# Altium footprint library Connector_PinHeader_1.27mm.PcbLib: 278 footprints (part 2 of 18)
Each footprint in its own frame and in the unit in brackets; x right, y up, seen from the top. Pads: shape width x height; smd on the part's side, far side on the other; paste and mask are expansions set on the pad; w line width, h text height; cw(c..) or ccw(c..) is an arc to the next point about the centre after c.
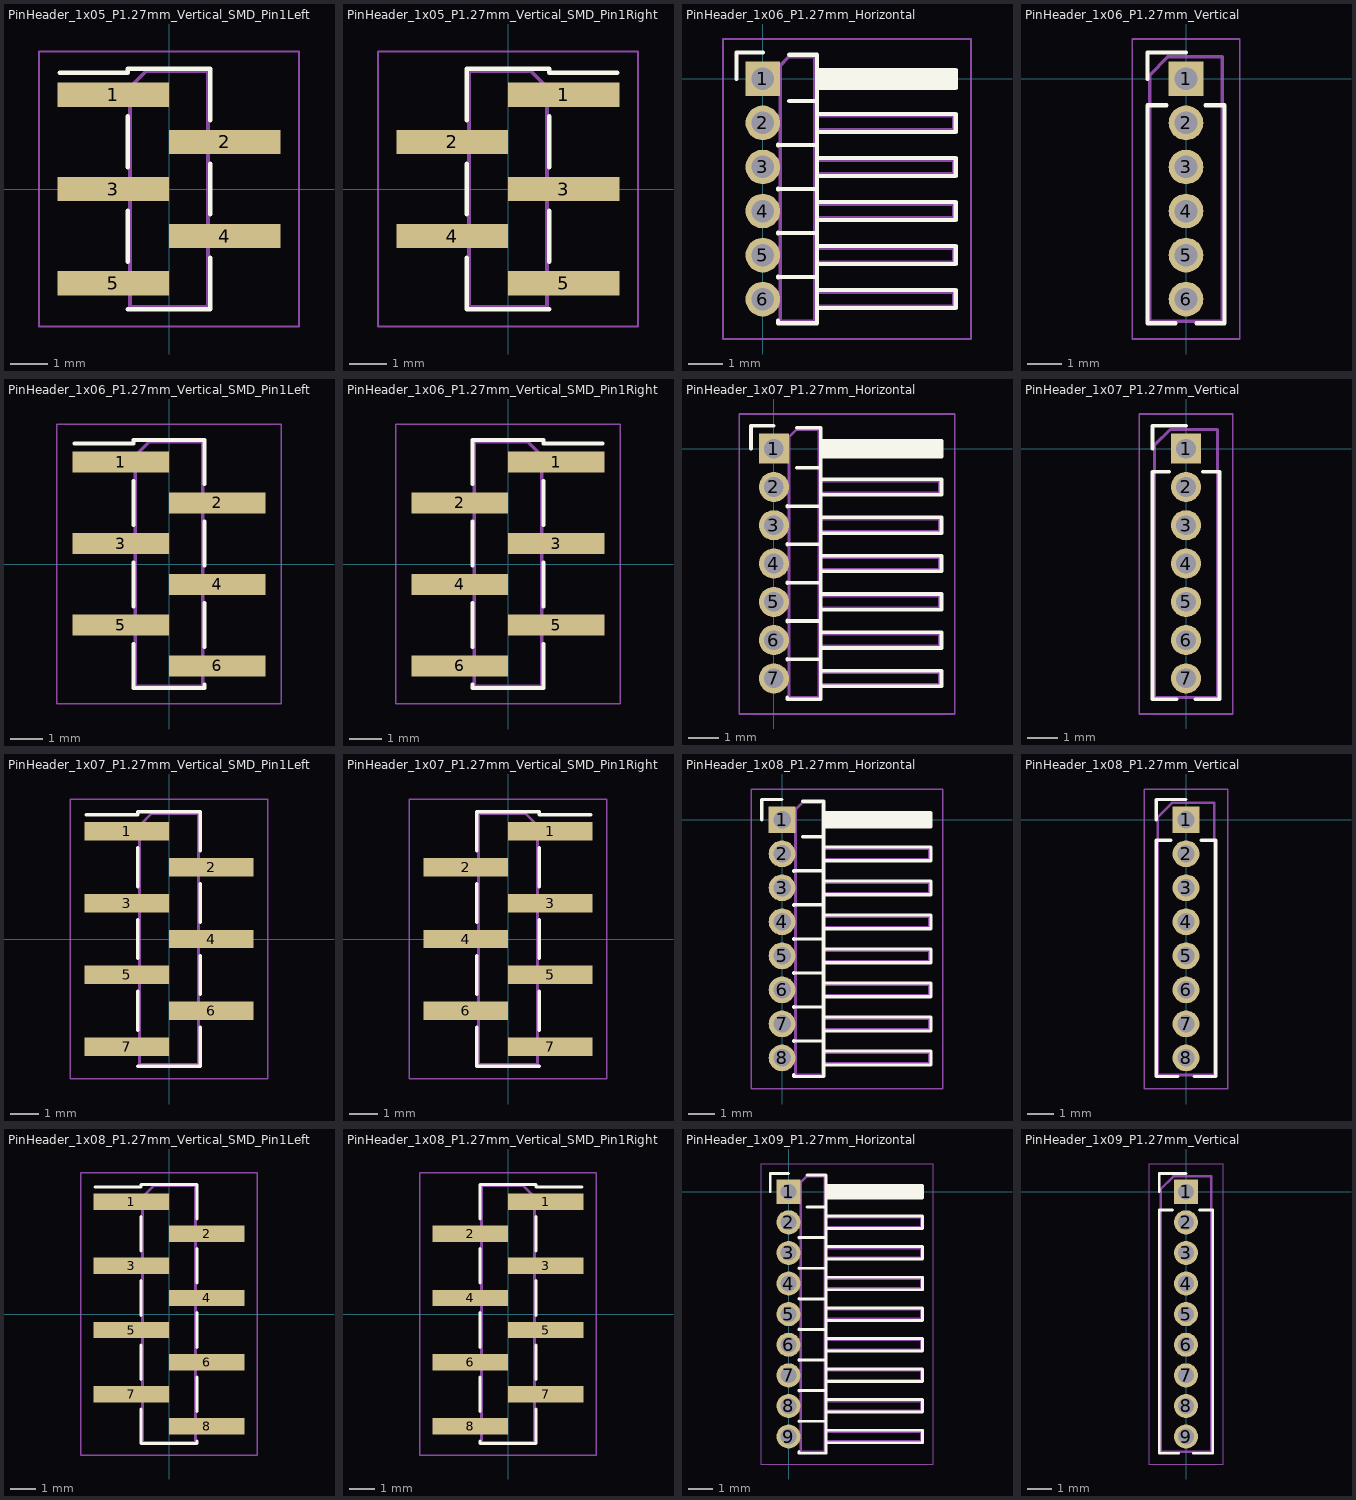
[diagram p1: the footprints below, top view; thin cyan lines are the x and y axes]

## PinHeader_1x05_P1.27mm_Vertical_SMD_Pin1Left [mm]
pads (5):
  rect 3x0.65 smd: 1(-1.5,2.54) 2(1.5,1.27) 3(-1.5,0) 4(1.5,-1.27) 5(-1.5,-2.54)
F.SilkS:
  lines w0.12: -2.94,3.125 -1.11,3.125 -1.11,3.235 1.11,3.235 ; -1.11,-3.235 1.11,-3.235 1.11,-3.125 ; -1.11,-1.955 -1.11,-0.585 ; -1.11,0.585 -1.11,1.955 ; 1.11,-3.225 1.11,-1.855 ; 1.11,-0.685 1.11,0.685 ; 1.11,1.855 1.11,3.225
F.CrtYd:
  lines w0.05: -3.5,-3.7 3.5,-3.7 3.5,3.7 -3.5,3.7 -3.5,-3.7
F.Fab:
  lines w0.1: -1.05,-2.74 -2.5,-2.74 -2.5,-2.34 -1.05,-2.34 ; -1.05,-0.2 -2.5,-0.2 -2.5,0.2 -1.05,0.2 ; -1.05,2.34 -2.5,2.34 -2.5,2.74 -1.05,2.74 ; 1.05,-1.47 2.5,-1.47 2.5,-1.07 1.05,-1.07 ; 1.05,1.07 2.5,1.07 2.5,1.47 1.05,1.47 ; -1.05,2.74 -0.615,3.175 1.05,3.175 1.05,-3.175 -1.05,-3.175 -1.05,2.74
  text "'.Designator'" at 0.84,-4.047 h1

## PinHeader_1x05_P1.27mm_Vertical_SMD_Pin1Right [mm]
pads (5):
  rect 3x0.65 smd: 1(1.5,2.54) 2(-1.5,1.27) 3(1.5,0) 4(-1.5,-1.27) 5(1.5,-2.54)
F.SilkS:
  lines w0.12: -1.11,-3.225 -1.11,-1.855 ; -1.11,-3.125 -1.11,-3.235 1.11,-3.235 ; -1.11,-0.685 -1.11,0.685 ; -1.11,1.855 -1.11,3.225 ; -1.11,3.235 1.11,3.235 1.11,3.125 2.94,3.125 ; 1.11,-1.955 1.11,-0.585 ; 1.11,0.585 1.11,1.955
F.CrtYd:
  lines w0.05: -3.5,-3.7 -3.5,3.7 3.5,3.7 3.5,-3.7 -3.5,-3.7
F.Fab:
  lines w0.1: -1.05,-1.47 -2.5,-1.47 -2.5,-1.07 -1.05,-1.07 ; -1.05,1.07 -2.5,1.07 -2.5,1.47 -1.05,1.47 ; 1.05,-2.74 2.5,-2.74 2.5,-2.34 1.05,-2.34 ; 1.05,-0.2 2.5,-0.2 2.5,0.2 1.05,0.2 ; 1.05,2.34 2.5,2.34 2.5,2.74 1.05,2.74 ; 1.05,2.74 1.05,-3.175 -1.05,-3.175 -1.05,3.175 0.615,3.175 1.05,2.74
  text "'.Designator'" at 0.84,-4.047 h1

## PinHeader_1x06_P1.27mm_Horizontal [mm]
pads (6):
  rect 1x1 hole 0.65: 1(0,0)
  rrect100% 1x1 hole 0.65: 2(0,-1.27) 3(0,-2.54) 4(0,-3.81) 5(0,-5.08) 6(0,-6.35)
F.SilkS:
  lines w0.12: -0.76,0 -0.76,0.76 0,0.76 ; 0.44,-6.97 0.44,-7.045 1.56,-7.045 1.56,0.695 0.76,0.695 ; 0.44,-5.73 0.44,-5.7 ; 0.44,-5.715 1.56,-5.715 ; 0.44,-4.46 0.44,-4.43 ; 0.44,-4.445 1.56,-4.445 ; 0.44,-3.19 0.44,-3.16 ; 0.44,-3.175 1.56,-3.175 ; 0.44,-1.92 0.44,-1.89 ; 0.44,-1.905 1.56,-1.905 ; 0.76,-0.635 1.56,-0.635 ; 1.56,-6.61 5.56,-6.61 5.56,-6.09 1.56,-6.09 ; 1.56,-5.34 5.56,-5.34 5.56,-4.82 1.56,-4.82 ; 1.56,-4.07 5.56,-4.07 5.56,-3.55 1.56,-3.55 ; 1.56,-2.8 5.56,-2.8 5.56,-2.28 1.56,-2.28 ; 1.56,-1.53 5.56,-1.53 5.56,-1.01 1.56,-1.01 ; 1.56,-0.26 5.56,-0.26 5.56,0.26 1.56,0.26 ; 1.56,-0.16 5.56,-0.16 ; 1.56,-0.04 5.56,-0.04 ; 1.56,0.08 5.56,0.08 ; 1.56,0.2 5.56,0.2
F.CrtYd:
  lines w0.05: -1.15,-7.5 6,-7.5 6,1.15 -1.15,1.15 -1.15,-7.5
F.Fab:
  lines w0.1: 0.5,-6.55 -0.2,-6.55 -0.2,-6.15 0.5,-6.15 ; 0.5,-5.28 -0.2,-5.28 -0.2,-4.88 0.5,-4.88 ; 0.5,-4.01 -0.2,-4.01 -0.2,-3.61 0.5,-3.61 ; 0.5,-2.74 -0.2,-2.74 -0.2,-2.34 0.5,-2.34 ; 0.5,-1.47 -0.2,-1.47 -0.2,-1.07 0.5,-1.07 ; 0.5,-0.2 -0.2,-0.2 -0.2,0.2 0.5,0.2 ; 1.5,-6.55 5.5,-6.55 5.5,-6.15 1.5,-6.15 ; 1.5,-5.28 5.5,-5.28 5.5,-4.88 1.5,-4.88 ; 1.5,-4.01 5.5,-4.01 5.5,-3.61 1.5,-3.61 ; 1.5,-2.74 5.5,-2.74 5.5,-2.34 1.5,-2.34 ; 1.5,-1.47 5.5,-1.47 5.5,-1.07 1.5,-1.07 ; 1.5,-0.2 5.5,-0.2 5.5,0.2 1.5,0.2 ; 0.5,-6.985 0.5,0.385 0.75,0.635 1.5,0.635 1.5,-6.985 0.5,-6.985
  text "'.Designator'" at 1.504,-5.603 h0.6

## PinHeader_1x06_P1.27mm_Vertical [mm]
pads (6):
  rect 1x1 hole 0.65: 1(0,0)
  rrect100% 1x1 hole 0.65: 2(0,-1.27) 3(0,-2.54) 4(0,-3.81) 5(0,-5.08) 6(0,-6.35)
F.SilkS:
  lines w0.12: -1.11,0 -1.11,0.76 0,0.76 ; -0.563,-0.76 -1.11,-0.76 -1.11,-7.045 -0.308,-7.045 ; 0.308,-7.045 1.11,-7.045 1.11,-0.76 0.563,-0.76
F.CrtYd:
  lines w0.05: -1.55,-7.5 1.55,-7.5 1.55,1.15 -1.55,1.15 -1.55,-7.5
F.Fab:
  lines w0.1: -1.05,-6.985 1.05,-6.985 1.05,0.635 -0.525,0.635 -1.05,0.11 -1.05,-6.985
  text "'.Designator'" at 0.84,-7.222 h1

## PinHeader_1x06_P1.27mm_Vertical_SMD_Pin1Left [mm]
pads (6):
  rect 3x0.65 smd: 1(-1.5,3.175) 2(1.5,1.905) 3(-1.5,0.635) 4(1.5,-0.635) 5(-1.5,-1.905) 6(1.5,-3.175)
F.SilkS:
  lines w0.12: -2.94,3.76 -1.11,3.76 -1.11,3.87 1.11,3.87 ; -1.11,-3.87 1.11,-3.87 1.11,-3.76 ; -1.11,-3.86 -1.11,-2.49 ; -1.11,-1.32 -1.11,0.05 ; -1.11,1.22 -1.11,2.59 ; 1.11,-2.59 1.11,-1.22 ; 1.11,-0.05 1.11,1.32 ; 1.11,2.49 1.11,3.86
F.CrtYd:
  lines w0.05: -3.5,-4.35 3.5,-4.35 3.5,4.35 -3.5,4.35 -3.5,-4.35
F.Fab:
  lines w0.1: -1.05,-2.105 -2.5,-2.105 -2.5,-1.705 -1.05,-1.705 ; -1.05,0.435 -2.5,0.435 -2.5,0.835 -1.05,0.835 ; -1.05,2.975 -2.5,2.975 -2.5,3.375 -1.05,3.375 ; 1.05,-3.375 2.5,-3.375 2.5,-2.975 1.05,-2.975 ; 1.05,-0.835 2.5,-0.835 2.5,-0.435 1.05,-0.435 ; 1.05,1.705 2.5,1.705 2.5,2.105 1.05,2.105 ; -1.05,3.375 -0.615,3.81 1.05,3.81 1.05,-3.81 -1.05,-3.81 -1.05,3.375
  text "'.Designator'" at 0.84,-4.047 h1

## PinHeader_1x06_P1.27mm_Vertical_SMD_Pin1Right [mm]
pads (6):
  rect 3x0.65 smd: 1(1.5,3.175) 2(-1.5,1.905) 3(1.5,0.635) 4(-1.5,-0.635) 5(1.5,-1.905) 6(-1.5,-3.175)
F.SilkS:
  lines w0.12: -1.11,-3.76 -1.11,-3.87 1.11,-3.87 ; -1.11,-2.59 -1.11,-1.22 ; -1.11,-0.05 -1.11,1.32 ; -1.11,2.49 -1.11,3.86 ; -1.11,3.87 1.11,3.87 1.11,3.76 2.94,3.76 ; 1.11,-3.86 1.11,-2.49 ; 1.11,-1.32 1.11,0.05 ; 1.11,1.22 1.11,2.59
F.CrtYd:
  lines w0.05: -3.5,-4.35 3.5,-4.35 3.5,4.35 -3.5,4.35 -3.5,-4.35
F.Fab:
  lines w0.1: -1.05,-3.375 -2.5,-3.375 -2.5,-2.975 -1.05,-2.975 ; -1.05,-0.835 -2.5,-0.835 -2.5,-0.435 -1.05,-0.435 ; -1.05,1.705 -2.5,1.705 -2.5,2.105 -1.05,2.105 ; 1.05,-2.105 2.5,-2.105 2.5,-1.705 1.05,-1.705 ; 1.05,0.435 2.5,0.435 2.5,0.835 1.05,0.835 ; 1.05,2.975 2.5,2.975 2.5,3.375 1.05,3.375 ; 1.05,3.375 0.615,3.81 -1.05,3.81 -1.05,-3.81 1.05,-3.81 1.05,3.375
  text "'.Designator'" at 0.84,-4.047 h1

## PinHeader_1x07_P1.27mm_Horizontal [mm]
pads (7):
  rect 1x1 hole 0.65: 1(0,0)
  rrect100% 1x1 hole 0.65: 2(0,-1.27) 3(0,-2.54) 4(0,-3.81) 5(0,-5.08) 6(0,-6.35) 7(0,-7.62)
F.SilkS:
  lines w0.12: -0.76,0 -0.76,0.76 0,0.76 ; 0.44,-8.24 0.44,-8.315 1.56,-8.315 1.56,0.695 0.76,0.695 ; 0.44,-7 0.44,-6.97 ; 0.44,-6.985 1.56,-6.985 ; 0.44,-5.73 0.44,-5.7 ; 0.44,-5.715 1.56,-5.715 ; 0.44,-4.46 0.44,-4.43 ; 0.44,-4.445 1.56,-4.445 ; 0.44,-3.19 0.44,-3.16 ; 0.44,-3.175 1.56,-3.175 ; 0.44,-1.92 0.44,-1.89 ; 0.44,-1.905 1.56,-1.905 ; 0.76,-0.635 1.56,-0.635 ; 1.56,-7.88 5.56,-7.88 5.56,-7.36 1.56,-7.36 ; 1.56,-6.61 5.56,-6.61 5.56,-6.09 1.56,-6.09 ; 1.56,-5.34 5.56,-5.34 5.56,-4.82 1.56,-4.82 ; 1.56,-4.07 5.56,-4.07 5.56,-3.55 1.56,-3.55 ; 1.56,-2.8 5.56,-2.8 5.56,-2.28 1.56,-2.28 ; 1.56,-1.53 5.56,-1.53 5.56,-1.01 1.56,-1.01 ; 1.56,-0.26 5.56,-0.26 5.56,0.26 1.56,0.26 ; 1.56,-0.16 5.56,-0.16 ; 1.56,-0.04 5.56,-0.04 ; 1.56,0.08 5.56,0.08 ; 1.56,0.2 5.56,0.2
F.CrtYd:
  lines w0.05: -1.15,-8.8 -1.15,1.15 6,1.15 6,-8.8 -1.15,-8.8
F.Fab:
  lines w0.1: 0.5,-7.82 -0.2,-7.82 -0.2,-7.42 0.5,-7.42 ; 0.5,-6.55 -0.2,-6.55 -0.2,-6.15 0.5,-6.15 ; 0.5,-5.28 -0.2,-5.28 -0.2,-4.88 0.5,-4.88 ; 0.5,-4.01 -0.2,-4.01 -0.2,-3.61 0.5,-3.61 ; 0.5,-2.74 -0.2,-2.74 -0.2,-2.34 0.5,-2.34 ; 0.5,-1.47 -0.2,-1.47 -0.2,-1.07 0.5,-1.07 ; 0.5,-0.2 -0.2,-0.2 -0.2,0.2 0.5,0.2 ; 1.5,-7.82 5.5,-7.82 5.5,-7.42 1.5,-7.42 ; 1.5,-6.55 5.5,-6.55 5.5,-6.15 1.5,-6.15 ; 1.5,-5.28 5.5,-5.28 5.5,-4.88 1.5,-4.88 ; 1.5,-4.01 5.5,-4.01 5.5,-3.61 1.5,-3.61 ; 1.5,-2.74 5.5,-2.74 5.5,-2.34 1.5,-2.34 ; 1.5,-1.47 5.5,-1.47 5.5,-1.07 1.5,-1.07 ; 1.5,-0.2 5.5,-0.2 5.5,0.2 1.5,0.2 ; 0.5,-8.255 1.5,-8.255 1.5,0.635 0.75,0.635 0.5,0.385 0.5,-8.255
  text "'.Designator'" at 1.504,-6.238 h0.6

## PinHeader_1x07_P1.27mm_Vertical [mm]
pads (7):
  rect 1x1 hole 0.65: 1(0,0)
  rrect100% 1x1 hole 0.65: 2(0,-1.27) 3(0,-2.54) 4(0,-3.81) 5(0,-5.08) 6(0,-6.35) 7(0,-7.62)
F.SilkS:
  lines w0.12: -1.11,0 -1.11,0.76 0,0.76 ; -0.563,-0.76 -1.11,-0.76 -1.11,-8.315 -0.308,-8.315 ; 0.308,-8.315 1.11,-8.315 1.11,-0.76 0.563,-0.76
F.CrtYd:
  lines w0.05: -1.55,-8.8 1.55,-8.8 1.55,1.15 -1.55,1.15 -1.55,-8.8
F.Fab:
  lines w0.1: -1.05,-8.255 -1.05,0.11 -0.525,0.635 1.05,0.635 1.05,-8.255 -1.05,-8.255
  text "'.Designator'" at 0.84,-7.857 h1

## PinHeader_1x07_P1.27mm_Vertical_SMD_Pin1Left [mm]
pads (7):
  rect 3x0.65 smd: 1(-1.5,3.81) 2(1.5,2.54) 3(-1.5,1.27) 4(1.5,0) 5(-1.5,-1.27) 6(1.5,-2.54) 7(-1.5,-3.81)
F.SilkS:
  lines w0.12: -2.94,4.395 -1.11,4.395 -1.11,4.505 1.11,4.505 ; -1.11,-4.505 1.11,-4.505 1.11,-4.395 ; -1.11,-3.225 -1.11,-1.855 ; -1.11,-0.685 -1.11,0.685 ; -1.11,1.855 -1.11,3.225 ; 1.11,-4.495 1.11,-3.125 ; 1.11,-1.955 1.11,-0.585 ; 1.11,0.585 1.11,1.955 ; 1.11,3.125 1.11,4.495
F.CrtYd:
  lines w0.05: -3.5,-4.95 -3.5,4.95 3.5,4.95 3.5,-4.95 -3.5,-4.95
F.Fab:
  lines w0.1: -1.05,-4.01 -2.5,-4.01 -2.5,-3.61 -1.05,-3.61 ; -1.05,-1.47 -2.5,-1.47 -2.5,-1.07 -1.05,-1.07 ; -1.05,1.07 -2.5,1.07 -2.5,1.47 -1.05,1.47 ; -1.05,3.61 -2.5,3.61 -2.5,4.01 -1.05,4.01 ; 1.05,-2.74 2.5,-2.74 2.5,-2.34 1.05,-2.34 ; 1.05,-0.2 2.5,-0.2 2.5,0.2 1.05,0.2 ; 1.05,2.34 2.5,2.34 2.5,2.74 1.05,2.74 ; -1.05,4.01 -0.615,4.445 1.05,4.445 1.05,-4.445 -1.05,-4.445 -1.05,4.01
  text "'.Designator'" at 0.84,-4.047 h1

## PinHeader_1x07_P1.27mm_Vertical_SMD_Pin1Right [mm]
pads (7):
  rect 3x0.65 smd: 1(1.5,3.81) 2(-1.5,2.54) 3(1.5,1.27) 4(-1.5,0) 5(1.5,-1.27) 6(-1.5,-2.54) 7(1.5,-3.81)
F.SilkS:
  lines w0.12: -1.11,-4.495 -1.11,-3.125 ; -1.11,-4.395 -1.11,-4.505 1.11,-4.505 ; -1.11,-1.955 -1.11,-0.585 ; -1.11,0.585 -1.11,1.955 ; -1.11,3.125 -1.11,4.495 ; -1.11,4.505 1.11,4.505 1.11,4.395 2.94,4.395 ; 1.11,-3.225 1.11,-1.855 ; 1.11,-0.685 1.11,0.685 ; 1.11,1.855 1.11,3.225
F.CrtYd:
  lines w0.05: -3.5,-4.95 3.5,-4.95 3.5,4.95 -3.5,4.95 -3.5,-4.95
F.Fab:
  lines w0.1: -1.05,-2.74 -2.5,-2.74 -2.5,-2.34 -1.05,-2.34 ; -1.05,-0.2 -2.5,-0.2 -2.5,0.2 -1.05,0.2 ; -1.05,2.34 -2.5,2.34 -2.5,2.74 -1.05,2.74 ; 1.05,-4.01 2.5,-4.01 2.5,-3.61 1.05,-3.61 ; 1.05,-1.47 2.5,-1.47 2.5,-1.07 1.05,-1.07 ; 1.05,1.07 2.5,1.07 2.5,1.47 1.05,1.47 ; 1.05,3.61 2.5,3.61 2.5,4.01 1.05,4.01 ; 1.05,4.01 0.615,4.445 -1.05,4.445 -1.05,-4.445 1.05,-4.445 1.05,4.01
  text "'.Designator'" at 0.84,-4.047 h1

## PinHeader_1x08_P1.27mm_Horizontal [mm]
pads (8):
  rect 1x1 hole 0.65: 1(0,0)
  rrect100% 1x1 hole 0.65: 2(0,-1.27) 3(0,-2.54) 4(0,-3.81) 5(0,-5.08) 6(0,-6.35) 7(0,-7.62) 8(0,-8.89)
F.SilkS:
  lines w0.12: -0.76,0 -0.76,0.76 0,0.76 ; 0.44,-9.51 0.44,-9.585 1.56,-9.585 1.56,0.695 0.76,0.695 ; 0.44,-8.27 0.44,-8.24 ; 0.44,-8.255 1.56,-8.255 ; 0.44,-7 0.44,-6.97 ; 0.44,-6.985 1.56,-6.985 ; 0.44,-5.73 0.44,-5.7 ; 0.44,-5.715 1.56,-5.715 ; 0.44,-4.46 0.44,-4.43 ; 0.44,-4.445 1.56,-4.445 ; 0.44,-3.19 0.44,-3.16 ; 0.44,-3.175 1.56,-3.175 ; 0.44,-1.92 0.44,-1.89 ; 0.44,-1.905 1.56,-1.905 ; 0.76,-0.635 1.56,-0.635 ; 1.56,-9.15 5.56,-9.15 5.56,-8.63 1.56,-8.63 ; 1.56,-7.88 5.56,-7.88 5.56,-7.36 1.56,-7.36 ; 1.56,-6.61 5.56,-6.61 5.56,-6.09 1.56,-6.09 ; 1.56,-5.34 5.56,-5.34 5.56,-4.82 1.56,-4.82 ; 1.56,-4.07 5.56,-4.07 5.56,-3.55 1.56,-3.55 ; 1.56,-2.8 5.56,-2.8 5.56,-2.28 1.56,-2.28 ; 1.56,-1.53 5.56,-1.53 5.56,-1.01 1.56,-1.01 ; 1.56,-0.26 5.56,-0.26 5.56,0.26 1.56,0.26 ; 1.56,-0.16 5.56,-0.16 ; 1.56,-0.04 5.56,-0.04 ; 1.56,0.08 5.56,0.08 ; 1.56,0.2 5.56,0.2
F.CrtYd:
  lines w0.05: -1.15,-10.05 -1.15,1.15 6,1.15 6,-10.05 -1.15,-10.05
F.Fab:
  lines w0.1: 0.5,-9.09 -0.2,-9.09 -0.2,-8.69 0.5,-8.69 ; 0.5,-7.82 -0.2,-7.82 -0.2,-7.42 0.5,-7.42 ; 0.5,-6.55 -0.2,-6.55 -0.2,-6.15 0.5,-6.15 ; 0.5,-5.28 -0.2,-5.28 -0.2,-4.88 0.5,-4.88 ; 0.5,-4.01 -0.2,-4.01 -0.2,-3.61 0.5,-3.61 ; 0.5,-2.74 -0.2,-2.74 -0.2,-2.34 0.5,-2.34 ; 0.5,-1.47 -0.2,-1.47 -0.2,-1.07 0.5,-1.07 ; 0.5,-0.2 -0.2,-0.2 -0.2,0.2 0.5,0.2 ; 1.5,-9.09 5.5,-9.09 5.5,-8.69 1.5,-8.69 ; 1.5,-7.82 5.5,-7.82 5.5,-7.42 1.5,-7.42 ; 1.5,-6.55 5.5,-6.55 5.5,-6.15 1.5,-6.15 ; 1.5,-5.28 5.5,-5.28 5.5,-4.88 1.5,-4.88 ; 1.5,-4.01 5.5,-4.01 5.5,-3.61 1.5,-3.61 ; 1.5,-2.74 5.5,-2.74 5.5,-2.34 1.5,-2.34 ; 1.5,-1.47 5.5,-1.47 5.5,-1.07 1.5,-1.07 ; 1.5,-0.2 5.5,-0.2 5.5,0.2 1.5,0.2 ; 0.5,-9.525 1.5,-9.525 1.5,0.635 0.75,0.635 0.5,0.385 0.5,-9.525
  text "'.Designator'" at 1.504,-6.873 h0.6

## PinHeader_1x08_P1.27mm_Vertical [mm]
pads (8):
  rect 1x1 hole 0.65: 1(0,0)
  rrect100% 1x1 hole 0.65: 2(0,-1.27) 3(0,-2.54) 4(0,-3.81) 5(0,-5.08) 6(0,-6.35) 7(0,-7.62) 8(0,-8.89)
F.SilkS:
  lines w0.12: -1.11,0 -1.11,0.76 0,0.76 ; -0.563,-0.76 -1.11,-0.76 -1.11,-9.585 -0.308,-9.585 ; 0.308,-9.585 1.11,-9.585 1.11,-0.76 0.563,-0.76
F.CrtYd:
  lines w0.05: -1.55,-10.05 1.55,-10.05 1.55,1.15 -1.55,1.15 -1.55,-10.05
F.Fab:
  lines w0.1: -1.05,-9.525 -1.05,0.11 -0.525,0.635 1.05,0.635 1.05,-9.525 -1.05,-9.525
  text "'.Designator'" at 0.84,-8.492 h1

## PinHeader_1x08_P1.27mm_Vertical_SMD_Pin1Left [mm]
pads (8):
  rect 3x0.65 smd: 1(-1.5,4.445) 2(1.5,3.175) 3(-1.5,1.905) 4(1.5,0.635) 5(-1.5,-0.635) 6(1.5,-1.905) 7(-1.5,-3.175) 8(1.5,-4.445)
F.SilkS:
  lines w0.12: -2.94,5.03 -1.11,5.03 -1.11,5.14 1.11,5.14 ; -1.11,-5.14 1.11,-5.14 1.11,-5.03 ; -1.11,-5.13 -1.11,-3.76 ; -1.11,-2.59 -1.11,-1.22 ; -1.11,-0.05 -1.11,1.32 ; -1.11,2.49 -1.11,3.86 ; 1.11,-3.86 1.11,-2.49 ; 1.11,-1.32 1.11,0.05 ; 1.11,1.22 1.11,2.59 ; 1.11,3.76 1.11,5.13
F.CrtYd:
  lines w0.05: -3.5,-5.6 3.5,-5.6 3.5,5.6 -3.5,5.6 -3.5,-5.6
F.Fab:
  lines w0.1: -1.05,-3.375 -2.5,-3.375 -2.5,-2.975 -1.05,-2.975 ; -1.05,-0.835 -2.5,-0.835 -2.5,-0.435 -1.05,-0.435 ; -1.05,1.705 -2.5,1.705 -2.5,2.105 -1.05,2.105 ; -1.05,4.245 -2.5,4.245 -2.5,4.645 -1.05,4.645 ; 1.05,-4.645 2.5,-4.645 2.5,-4.245 1.05,-4.245 ; 1.05,-2.105 2.5,-2.105 2.5,-1.705 1.05,-1.705 ; 1.05,0.435 2.5,0.435 2.5,0.835 1.05,0.835 ; 1.05,2.975 2.5,2.975 2.5,3.375 1.05,3.375 ; -1.05,4.645 -0.615,5.08 1.05,5.08 1.05,-5.08 -1.05,-5.08 -1.05,4.645
  text "'.Designator'" at 0.84,-4.047 h1

## PinHeader_1x08_P1.27mm_Vertical_SMD_Pin1Right [mm]
pads (8):
  rect 3x0.65 smd: 1(1.5,4.445) 2(-1.5,3.175) 3(1.5,1.905) 4(-1.5,0.635) 5(1.5,-0.635) 6(-1.5,-1.905) 7(1.5,-3.175) 8(-1.5,-4.445)
F.SilkS:
  lines w0.12: -1.11,-5.03 -1.11,-5.14 1.11,-5.14 ; -1.11,-3.86 -1.11,-2.49 ; -1.11,-1.32 -1.11,0.05 ; -1.11,1.22 -1.11,2.59 ; -1.11,3.76 -1.11,5.13 ; -1.11,5.14 1.11,5.14 1.11,5.03 2.94,5.03 ; 1.11,-5.13 1.11,-3.76 ; 1.11,-2.59 1.11,-1.22 ; 1.11,-0.05 1.11,1.32 ; 1.11,2.49 1.11,3.86
F.CrtYd:
  lines w0.05: -3.5,-5.6 3.5,-5.6 3.5,5.6 -3.5,5.6 -3.5,-5.6
F.Fab:
  lines w0.1: -1.05,-4.645 -2.5,-4.645 -2.5,-4.245 -1.05,-4.245 ; -1.05,-2.105 -2.5,-2.105 -2.5,-1.705 -1.05,-1.705 ; -1.05,0.435 -2.5,0.435 -2.5,0.835 -1.05,0.835 ; -1.05,2.975 -2.5,2.975 -2.5,3.375 -1.05,3.375 ; 1.05,-3.375 2.5,-3.375 2.5,-2.975 1.05,-2.975 ; 1.05,-0.835 2.5,-0.835 2.5,-0.435 1.05,-0.435 ; 1.05,1.705 2.5,1.705 2.5,2.105 1.05,2.105 ; 1.05,4.245 2.5,4.245 2.5,4.645 1.05,4.645 ; 1.05,4.645 0.615,5.08 -1.05,5.08 -1.05,-5.08 1.05,-5.08 1.05,4.645
  text "'.Designator'" at 0.84,-4.047 h1

## PinHeader_1x09_P1.27mm_Horizontal [mm]
pads (9):
  rect 1x1 hole 0.65: 1(0,0)
  rrect100% 1x1 hole 0.65: 2(0,-1.27) 3(0,-2.54) 4(0,-3.81) 5(0,-5.08) 6(0,-6.35) 7(0,-7.62) 8(0,-8.89) 9(0,-10.16)
F.SilkS:
  lines w0.12: -0.76,0 -0.76,0.76 0,0.76 ; 0.44,-10.78 0.44,-10.855 1.56,-10.855 1.56,0.695 0.76,0.695 ; 0.44,-9.54 0.44,-9.51 ; 0.44,-9.525 1.56,-9.525 ; 0.44,-8.27 0.44,-8.24 ; 0.44,-8.255 1.56,-8.255 ; 0.44,-7 0.44,-6.97 ; 0.44,-6.985 1.56,-6.985 ; 0.44,-5.73 0.44,-5.7 ; 0.44,-5.715 1.56,-5.715 ; 0.44,-4.46 0.44,-4.43 ; 0.44,-4.445 1.56,-4.445 ; 0.44,-3.19 0.44,-3.16 ; 0.44,-3.175 1.56,-3.175 ; 0.44,-1.92 0.44,-1.89 ; 0.44,-1.905 1.56,-1.905 ; 0.76,-0.635 1.56,-0.635 ; 1.56,-10.42 5.56,-10.42 5.56,-9.9 1.56,-9.9 ; 1.56,-9.15 5.56,-9.15 5.56,-8.63 1.56,-8.63 ; 1.56,-7.88 5.56,-7.88 5.56,-7.36 1.56,-7.36 ; 1.56,-6.61 5.56,-6.61 5.56,-6.09 1.56,-6.09 ; 1.56,-5.34 5.56,-5.34 5.56,-4.82 1.56,-4.82 ; 1.56,-4.07 5.56,-4.07 5.56,-3.55 1.56,-3.55 ; 1.56,-2.8 5.56,-2.8 5.56,-2.28 1.56,-2.28 ; 1.56,-1.53 5.56,-1.53 5.56,-1.01 1.56,-1.01 ; 1.56,-0.26 5.56,-0.26 5.56,0.26 1.56,0.26 ; 1.56,-0.16 5.56,-0.16 ; 1.56,-0.04 5.56,-0.04 ; 1.56,0.08 5.56,0.08 ; 1.56,0.2 5.56,0.2
F.CrtYd:
  lines w0.05: -1.15,-11.3 6,-11.3 6,1.15 -1.15,1.15 -1.15,-11.3
F.Fab:
  lines w0.1: 0.5,-10.36 -0.2,-10.36 -0.2,-9.96 0.5,-9.96 ; 0.5,-9.09 -0.2,-9.09 -0.2,-8.69 0.5,-8.69 ; 0.5,-7.82 -0.2,-7.82 -0.2,-7.42 0.5,-7.42 ; 0.5,-6.55 -0.2,-6.55 -0.2,-6.15 0.5,-6.15 ; 0.5,-5.28 -0.2,-5.28 -0.2,-4.88 0.5,-4.88 ; 0.5,-4.01 -0.2,-4.01 -0.2,-3.61 0.5,-3.61 ; 0.5,-2.74 -0.2,-2.74 -0.2,-2.34 0.5,-2.34 ; 0.5,-1.47 -0.2,-1.47 -0.2,-1.07 0.5,-1.07 ; 0.5,-0.2 -0.2,-0.2 -0.2,0.2 0.5,0.2 ; 1.5,-10.36 5.5,-10.36 5.5,-9.96 1.5,-9.96 ; 1.5,-9.09 5.5,-9.09 5.5,-8.69 1.5,-8.69 ; 1.5,-7.82 5.5,-7.82 5.5,-7.42 1.5,-7.42 ; 1.5,-6.55 5.5,-6.55 5.5,-6.15 1.5,-6.15 ; 1.5,-5.28 5.5,-5.28 5.5,-4.88 1.5,-4.88 ; 1.5,-4.01 5.5,-4.01 5.5,-3.61 1.5,-3.61 ; 1.5,-2.74 5.5,-2.74 5.5,-2.34 1.5,-2.34 ; 1.5,-1.47 5.5,-1.47 5.5,-1.07 1.5,-1.07 ; 1.5,-0.2 5.5,-0.2 5.5,0.2 1.5,0.2 ; 0.5,-10.795 1.5,-10.795 1.5,0.635 0.75,0.635 0.5,0.385 0.5,-10.795
  text "'.Designator'" at 1.504,-7.508 h0.6

## PinHeader_1x09_P1.27mm_Vertical [mm]
pads (9):
  rect 1x1 hole 0.65: 1(0,0)
  rrect100% 1x1 hole 0.65: 2(0,-1.27) 3(0,-2.54) 4(0,-3.81) 5(0,-5.08) 6(0,-6.35) 7(0,-7.62) 8(0,-8.89) 9(0,-10.16)
F.SilkS:
  lines w0.12: -1.11,0 -1.11,0.76 0,0.76 ; -0.563,-0.76 -1.11,-0.76 -1.11,-10.855 -0.308,-10.855 ; 0.308,-10.855 1.11,-10.855 1.11,-0.76 0.563,-0.76
F.CrtYd:
  lines w0.05: -1.55,-11.3 1.55,-11.3 1.55,1.15 -1.55,1.15 -1.55,-11.3
F.Fab:
  lines w0.1: -1.05,-10.795 -1.05,0.11 -0.525,0.635 1.05,0.635 1.05,-10.795 -1.05,-10.795
  text "'.Designator'" at 0.84,-9.127 h1